# Altium footprint library lib_protel_HC.PCBLIB: 724 footprints (part 19 of 46)
Each footprint in its own frame and in the unit in brackets; x right, y up, seen from the top. Pads: shape width x height; smd on the part's side, far side on the other; paste and mask are expansions set on the pad; w line width, h text height; cw(c..) or ccw(c..) is an arc to the next point about the centre after c.
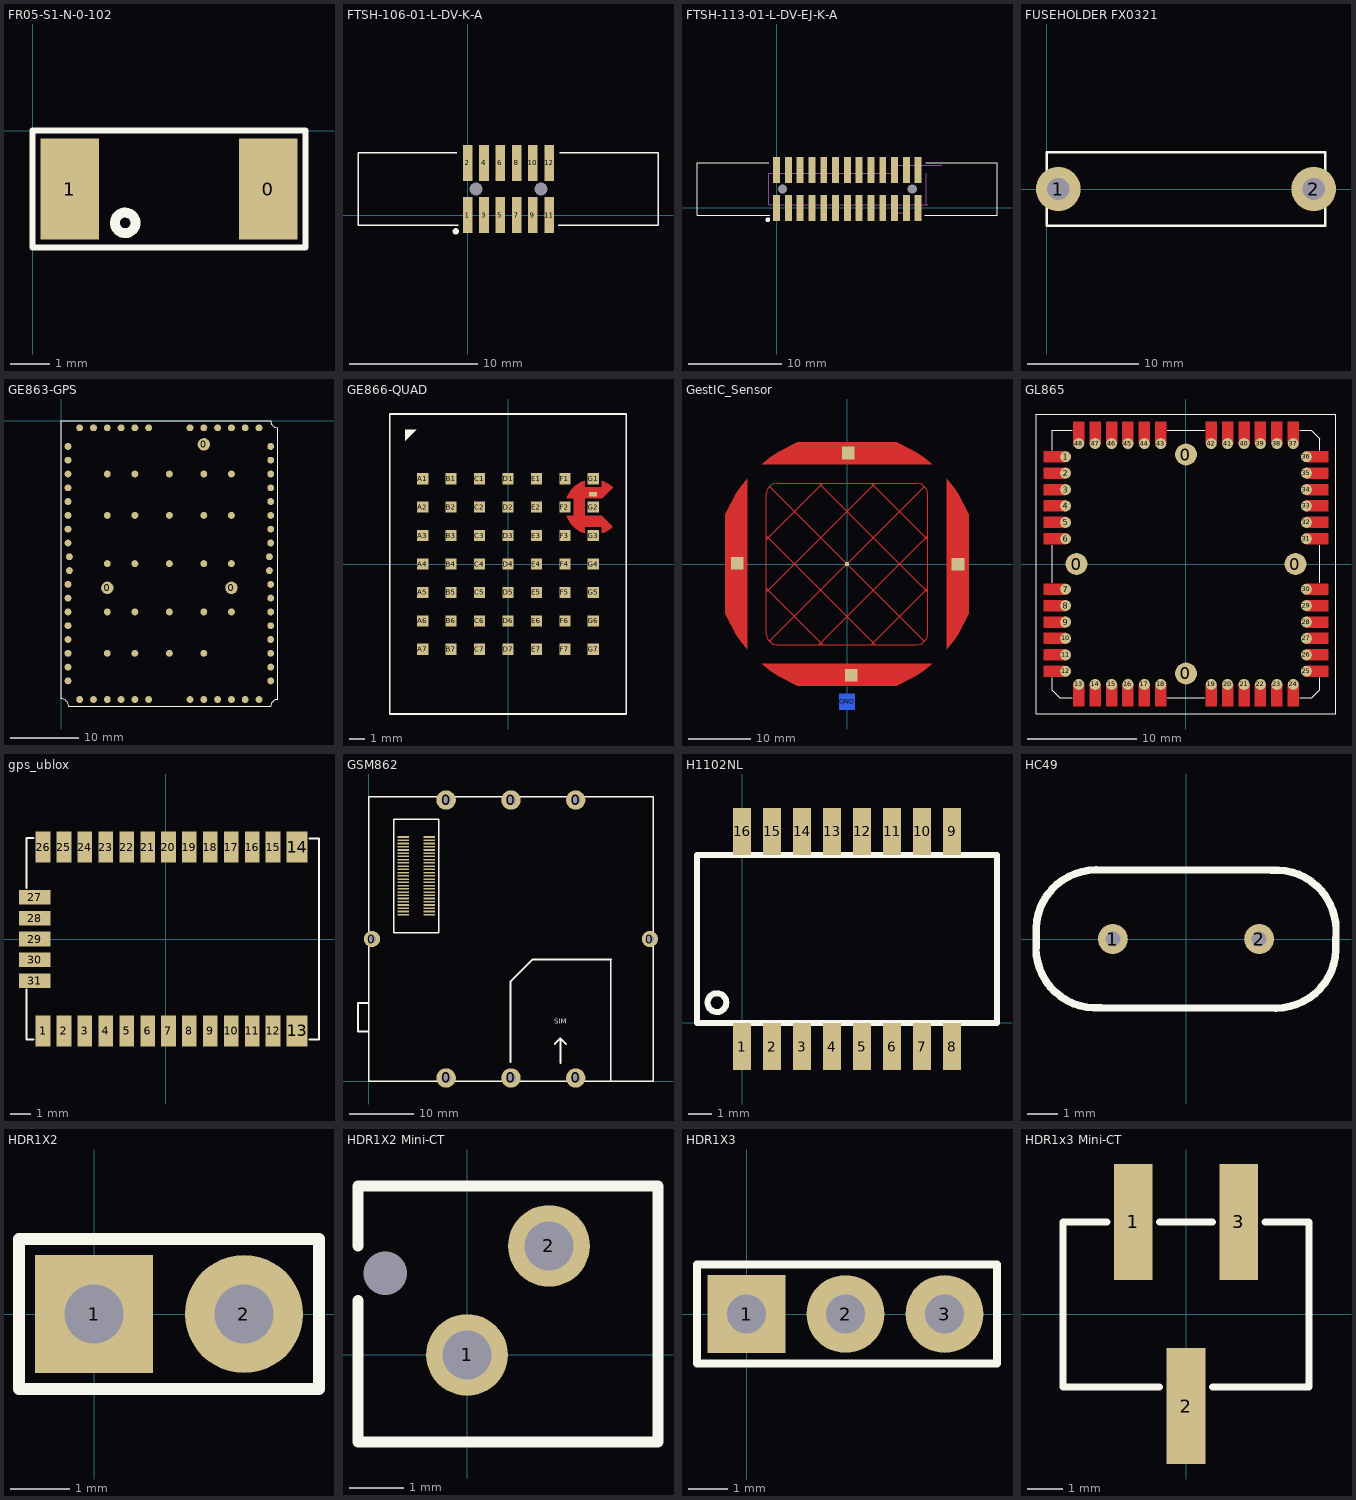
[diagram p18: the footprints below, top view; thin cyan lines are the x and y axes]

## FR05-S1-N-0-102 [mm] "ANTENA ZIGBEE"
height 2
pads (2):
  rect 1.5x2.6 smd: 0(6.05,-1.5) 1(0.95,-1.5)
Top Overlay:
  circle w0.254: c2.376,-2.37 r0.264
  lines w0.15: 0,-3 7,-3 7,0 0,0 0,-3

## FTSH-106-01-L-DV-K-A [mm] "CONNECTOR SAMTEC FTSH-106-01-L-DV-K-A"
height 5.7
pads (14):
  round 0.5 hole 1 unplated mask+0: 0(0.635,2.03) 0(5.715,2.03)
  rect 0.75x2.8 smd mask+0: 1(0,0) 2(0,4.06) 3(1.27,0) 4(1.27,4.06) 5(2.54,0) 6(2.54,4.06) 7(3.81,0) 8(3.81,4.06) 9(5.08,0) 10(5.08,4.06) 11(6.35,0) 12(6.35,4.06)
Top Overlay:
  circle w0.25: c-0.938,-1.27 r0.125
  lines w0.1: -0.864,4.851 -8.56,4.851 -8.56,-0.787 -0.737,-0.787 ; 7.061,-0.787 14.834,-0.787 14.834,4.851 7.163,4.851

## FTSH-113-01-L-DV-EJ-K-A [mm] "CONNECTOR SAMTEC FTSH-113-01-L-DV-EJ-K-A"
height 5.7
pads (28):
  round 0.5 hole 1 unplated mask+0: 0(0.635,2.03) 0(14.605,2.03)
  rect 0.75x2.8 smd mask+0: 1(0,0) 2(0,4.06) 3(1.27,0) 4(1.27,4.06) 5(2.54,0) 6(2.54,4.06) 7(3.81,0) 8(3.81,4.06) 9(5.08,0) 10(5.08,4.06) 11(6.35,0) 12(6.35,4.06) 13(7.62,0) 14(7.62,4.06) 15(8.89,0) 16(8.89,4.06) 17(10.16,0) 18(10.16,4.06) 19(11.43,0) 20(11.43,4.06) 21(12.7,0) 22(12.7,4.06) 23(13.97,0) 24(13.97,4.06) 25(15.24,0) 26(15.24,4.06)
Top Overlay:
  circle w0.25: c-0.938,-1.27 r0.125
  lines w0.1: -0.864,4.851 -8.56,4.851 -8.56,-0.787 -0.737,-0.787 ; 15.951,-0.787 23.724,-0.787 23.724,4.851 16.053,4.851
Mechanical 12:
  lines w0.001: 16.1,0.33 16.1,3.73 ; 16.34,0.33 14.14,0.33 14.14,-0.51 12.69,-0.51 12.69,0.33 -0.86,0.33 -0.86,3.73 12.54,3.73 12.54,4.58 17.79,4.58
Mechanical 13:
  lines w0.1: 12.54,3.73 12.54,4.58 ; 12.69,-0.51 12.69,0.33 14.14,0.33 14.14,-0.51 12.69,-0.51

## FUSEHOLDER FX0321 [mm] "PORTAFUSIBLES HASTA 6.3A"
height 10
pads (2):
  round 4 hole 2 mask+0.1: 1(1.041,0) 2(23.952,0)
Top Overlay:
  lines w0.254: 0,-0.051 0,-3.302 24.994,-3.302 24.994,3.302 0,3.302 0,0

## GE863-GPS [mm]
pads (87):
  round 1.8 smd: 0(6.7,-24.194) 0(20.7,-3.394) 0(24.7,-24.194)
  round 1 smd: 1(1,-3.694) 2(1,-5.694) 3(1,-7.694) 4(1,-9.694) 5(1,-11.694) 6(1,-13.694) 7(1,-15.694) 8(1,-17.694) 9(1,-23.694) 10(1,-25.694) 11(1,-27.694) 12(1,-29.694) 13(1,-31.694) 14(1,-33.694) 15(1,-35.694) 16(1,-37.694) 17(2.7,-40.394) 18(4.7,-40.394) 19(6.7,-40.394) 20(8.7,-40.394) 21(10.7,-40.394) 22(12.7,-40.394) 23(18.7,-40.394) 24(20.7,-40.394) 25(22.7,-40.394) 26(24.7,-40.394) 27(26.7,-40.394) 28(28.7,-40.394) 29(30.4,-37.694) 30(30.4,-35.694) 31(30.4,-33.694) 32(30.4,-31.694) 33(30.4,-29.694) 34(30.4,-27.694) 35(30.4,-25.694) 36(30.4,-23.694) 37(30.4,-17.694) 38(30.4,-15.694) 39(30.4,-13.694) 40(30.4,-11.694) 41(30.4,-9.694) 42(30.4,-7.694) 43(30.4,-5.694) 44(30.4,-3.694) 45(28.7,-0.994) 46(26.7,-0.994) 47(24.7,-0.994) 48(22.7,-0.994) 49(20.7,-0.994) 50(18.7,-0.994) 51(12.7,-0.994) 52(10.7,-0.994) 53(8.7,-0.994) 54(6.7,-0.994) 55(4.7,-0.994) 56(2.7,-0.994) 57(6.7,-7.694) 58(6.7,-13.694) 59(6.7,-20.694) 60(6.7,-27.694) 61(6.7,-33.694) 62(10.7,-7.694) 63(10.7,-13.694) 64(10.7,-20.694) 65(10.7,-27.694) 66(10.7,-33.694) 67(15.7,-7.694) 68(15.7,-13.694) 69(15.7,-20.694) 70(15.7,-27.694) 71(15.7,-33.694) 72(20.7,-7.694) 73(20.7,-13.694) 74(20.7,-20.694) 75(20.7,-27.694) 76(20.7,-33.694) 77(24.7,-7.694) 78(24.7,-13.694) 79(24.7,-20.694) 80(24.7,-27.694) 81(1.2,-19.694) 82(1.2,-21.694) 83(30.2,-21.694) 84(30.2,-19.694)
Top Overlay:
  lines w0.127: 0,-40.294 cw(c0,-41.394) 1.1,-41.394 30.4,-41.394 cw(c31.4,-41.394) 31.4,-40.394 31.4,-0.994 cw(c31.4,0.006) 30.4,0.006 0,0.006 0,-40.294

## GE866-QUAD [mm]
height 2.2
pads (50):
  rect 0.5x0.3 smd paste+0: 0(5.38,4.42)
  rect 0.7x0.7 smd: A1(-5.4,5.4) A2(-5.4,3.6) A3(-5.4,1.8) A4(-5.4,0) A5(-5.4,-1.8) A6(-5.4,-3.6) A7(-5.4,-5.4) B1(-3.6,5.4) B2(-3.6,3.6) B3(-3.6,1.8) B4(-3.6,0) B5(-3.6,-1.8) B6(-3.6,-3.6) B7(-3.6,-5.4) C1(-1.8,5.4) C2(-1.8,3.6) C3(-1.8,1.8) C4(-1.8,0) C5(-1.8,-1.8) C6(-1.8,-3.6) C7(-1.8,-5.4) D1(0,5.4) D2(0,3.6) D3(0,1.8) D4(0,0) D5(0,-1.8) D6(0,-3.6) D7(0,-5.4) E1(1.8,5.4) E2(1.8,3.6) E3(1.8,1.8) E4(1.8,0) E5(1.8,-1.8) E6(1.8,-3.6) E7(1.8,-5.4) F1(3.6,5.4) F2(3.6,3.6) F3(3.6,1.8) F4(3.6,0) F5(3.6,-1.8) F6(3.6,-3.6) F7(3.6,-5.4) G1(5.4,5.4) G2(5.4,3.6) G3(5.4,1.8) G4(5.4,0) G5(5.4,-1.8) G6(5.4,-3.6) G7(5.4,-5.4)
Top Layer:
  region: 4.848,1.939 4.85,1.939 4.852,1.939 4.854,1.941 4.855,1.943 4.855,1.944 4.855,2.363 5.945,2.363 5.945,1.945 5.945,1.944 5.945,1.943 5.945,1.942 5.946,1.941 5.947,1.94 5.949,1.939 5.951,1.939 5.952,1.939 5.95,1.939 5.952,1.939 6.049,1.972 6.234,2.058 6.408,2.165 6.569,2.292 6.641,2.365 6.642,2.365 6.642,2.366 6.643,2.367 6.643,2.368 6.643,2.369 6.643,2.37 6.642,2.371 6.642,2.372 6.641,2.372 5.952,3.049 5.951,3.049 5.95,3.05 5.948,3.05 4.85,3.05 4.85,3.6 4.85,4.15 5.95,4.15 5.951,4.15 5.952,4.151 5.953,4.151 5.953,4.152 5.954,4.152 6.641,4.839 6.642,4.84 6.642,4.841 6.643,4.842 6.643,4.843 6.643,4.844 6.643,4.845 6.642,4.846 6.642,4.847 6.641,4.847 6.569,4.919 6.408,5.046 6.234,5.154 6.049,5.24 5.952,5.272 5.95,5.273 5.948,5.272 5.946,5.271 5.945,5.268 5.945,5.267 5.945,4.849 4.855,4.849 4.855,5.267 4.855,5.268 4.854,5.271 4.852,5.272 4.85,5.273 4.848,5.272 4.653,5.208 4.304,4.992 4.014,4.702 3.798,4.352 3.734,4.158 3.733,4.156 3.734,4.154 3.735,4.152 3.737,4.15 3.739,4.15 4.157,4.15 4.157,3.061 3.739,3.061 3.737,3.061 3.735,3.06 3.734,3.058 3.733,3.055 3.734,3.054 3.798,2.859 4.014,2.51 4.304,2.219 4.653,2.004
Top Overlay:
  region: -6.5,7.8 -6.5,8.5 -5.8,8.5
  lines w0.1: -7.5,-9.5 -7.5,9.5 7.5,9.5 7.5,-9.5 -7.5,-9.5
3D body: height 2.2, standoff 0, extent -7.45,-9.5 7.45,9.5

## GestIC_Sensor [mm]
height 1.546
pads (7):
  round 0.7 smd: Centro(-0.003,0.003)
  rect 2x2 smd mask+0.102: Este(17.725,-0.05) Norte(0.175,17.725) Oeste(-17.5,0.125)
  rect 2.54x2.54 smd far side: GND(0,-22)
  rect 2x2 smd: Sur(0.675,-17.8)
  round 0.75 on Mid2: Tx(10.022,4.775)
Top Layer:
  region: 15.9,13.641 15.9,-13.641 16.175,-13.321 16.698,-12.66 17.194,-11.978 17.662,-11.276 18.101,-10.556 18.511,-9.819 18.891,-9.066 19.241,-8.299 19.4,-7.908 19.4,7.908 19.241,8.299 18.891,9.066 18.511,9.819 18.101,10.556 17.662,11.276 17.194,11.978 16.698,12.66 16.175,13.321
  region: 13.641,-15.9 -13.641,-15.9 -13.321,-16.175 -12.66,-16.698 -11.978,-17.194 -11.276,-17.662 -10.556,-18.101 -9.819,-18.511 -9.066,-18.891 -8.299,-19.241 -7.908,-19.4 7.908,-19.4 8.299,-19.241 9.066,-18.891 9.819,-18.511 10.556,-18.101 11.276,-17.662 11.978,-17.194 12.66,-16.698 13.321,-16.175
  region: -15.9,-13.641 -15.9,13.641 -16.175,13.321 -16.698,12.66 -17.194,11.978 -17.662,11.276 -18.101,10.556 -18.511,9.819 -18.891,9.066 -19.241,8.299 -19.4,7.908 -19.4,-7.908 -19.241,-8.299 -18.891,-9.066 -18.511,-9.819 -18.101,-10.556 -17.662,-11.276 -17.194,-11.978 -16.698,-12.66 -16.175,-13.321
  region: -13.641,15.9 13.641,15.9 13.321,16.175 12.66,16.698 11.978,17.194 11.276,17.662 10.556,18.101 9.819,18.511 9.066,18.891 8.299,19.241 7.908,19.4 -7.908,19.4 -8.299,19.241 -9.066,18.891 -9.819,18.511 -10.556,18.101 -11.276,17.662 -11.978,17.194 -12.66,16.698 -13.321,16.175
  lines w0.125: -12.9,-11.1 ccw(c-11.1,-11.1) -11.1,-12.901 ; -12.9,-11.075 -12.9,11.108 ; -12.901,-4.524 4.5,12.877 ; -12.9,-3.855 -3.865,-12.89 ; -12.9,11.107 cw(c-11.108,11.108) -11.107,12.9 11.1,12.9 ; -12.892,3.858 -3.858,12.892 ; -12.873,4.5 4.526,-12.899 ; -12.378,-12.372 12.367,12.372 ; -12.375,12.375 12.37,-12.37 ; -11.125,-12.9 11.1,-12.9 ccw(c11.1,-11.1) 12.9,-11.1 ; -4.526,12.899 12.873,-4.5 ; -4.5,-12.877 12.901,4.524 ; 3.858,-12.892 12.892,-3.858 ; 3.865,12.89 12.9,3.855 ; 11.1,12.9 cw(c11.1,11.1) 12.9,11.1 ; 12.9,-11.15 12.9,11.074
Mid-Layer 2:
  circle w0.25: c10.022,4.775 r0.75
  circle w0.225: c0,0 r23.95
  circle w0.25: c0,0 r0.75
  lines w0.225: -23.95,0 -17.125,-0.001 ; -23.832,-2.379 -12.907,-2.379 ; -23.832,2.379 -12.907,2.379 ; -23.639,-3.839 -23.639,3.834 ; -23.473,-4.748 -12.907,-4.748 ; -23.473,4.748 -12.907,4.748 ; -22.867,7.117 -12.907,7.117 ; -22.863,-7.117 -12.907,-7.117 ; -21.996,-9.486 -12.907,-9.486 ; -21.989,9.486 -12.907,9.486 ; -21.27,-11 -21.27,11 ; -20.816,-11.855 -12.741,-11.855 ; -20.811,11.855 -12.741,11.855 ; -19.266,-14.224 1.05,-14.224 ; -19.224,14.224 -4.85,14.224 ; -18.901,-14.701 -18.901,14.7 ; -17.268,-16.593 0.775,-16.593 ; -17.268,16.593 -4.45,16.593 ; -16.532,-17.325 -16.532,-0.75 ; -16.532,0.732 -16.532,17.325 ; -14.625,-18.962 14.625,-18.962 ; -14.625,18.962 14.625,18.962 ; -14.163,-19.312 -14.163,-0.448 ; -14.163,0.466 -14.163,19.312 ; -12.907,0.45 -12.907,11.075 -4.85,11.075 ; -12.907,0.827 -4.6,0.827 ; -12.907,5.089 -4.425,5.089 ; -12.906,4.25 -4.425,4.25 ; -12.9,-10.275 1.05,-10.275 ; -12.9,-9.421 1.05,-9.421 ; -12.9,-8.567 1.05,-8.567 ; -12.9,-7.713 1.05,-7.713 ; -12.9,-6.859 1.05,-6.859 ; -12.9,-6.005 1.05,-6.005 ; -12.9,-5.151 1.05,-5.151 ; -12.9,-4.297 1.05,-4.297 ; -12.9,-3.443 1.05,-3.443 ; -12.9,-2.589 1.05,-2.589 ; -12.9,-1.735 1.05,-1.735 ; -12.9,-0.881 1.05,-0.881 ; -12.9,-0.45 -12.9,-11.1 ccw(c-11.1,-11.1) -11.1,-12.9 ; -12.9,7.659 -4.4,7.659 ; -12.9,11.1 cw(c-11.1,11.1) -11.1,12.9 ; -12.897,2.535 -4.425,2.535 ; -12.897,6.805 -4.425,6.805 ; -12.897,10.221 -4.85,10.221 ; -12.894,-11.129 1.05,-11.129 ; -12.894,1.681 -4.575,1.681 ; -12.892,9.367 -4.85,9.367 ; -12.889,3.389 -4.425,3.389 ; -12.884,8.513 -4.85,8.513 ; -12.876,5.951 -4.425,5.951 ; -12.791,-11.71 -12.791,-0.448 ; -12.791,0.441 -12.791,11.719 ; -12.675,-11.983 1.05,-11.983 ; -12.654,11.929 -4.85,11.929 ; -11.937,-12.688 -11.937,-0.448 ; -11.937,0.45 -11.937,12.688 ; -11.794,-20.844 -11.794,-12.769 ; -11.794,12.766 -11.794,20.843 ; -11.562,-12.837 1.049,-12.837 ; -11.1,0.45 -11.1,12.899 ; -11.083,-0.448 -11.083,-12.9 1.05,-12.9 ; -10.887,-21.331 10.875,-21.331 ; -10.887,21.331 10.875,21.331 ; -10.229,-12.9 -10.229,-0.448 ; -10.229,0.45 -10.229,12.9 ; -9.425,-22.025 -9.425,-12.9 ; -9.425,12.9 -9.425,22.024 ; -9.375,-12.9 -9.375,-0.448 ; -9.375,0.45 -9.375,12.9 ; -8.521,-12.9 -8.521,-0.448 ; -8.521,0.451 -8.521,12.9 ; -7.667,-12.9 -7.667,-0.448 ; -7.667,0.451 -7.667,12.9 ; -7.056,-22.881 -7.056,-12.9 ; -7.056,12.9 -7.056,22.88 ; -6.813,-12.9 -6.813,-0.448 ; -6.813,0.451 -6.813,12.9 ; -5.959,-12.9 -5.959,-0.448 ; -5.959,0.451 -5.959,12.9 ; -5.105,-12.9 -5.105,-0.448 ; -5.105,0.45 -5.105,12.9 ; -4.85,12.899 -11.1,12.899 ; -4.687,-23.487 -4.687,-12.9 ; -4.687,15.4 -4.687,17.25 ; -4.687,17.737 -4.687,23.486 ; -4.251,-12.9 -4.251,-0.448 ; -3.9,8.513 12.9,8.513 ; -3.9,9.367 12.9,9.367 ; -3.9,10.224 12.9,10.221 ; -3.9,11.075 12.9,11.075 12.9,0.45 ; -3.9,11.929 12.7,11.929 ; -3.9,12.9 11.1,12.9 cw(c11.1,11.1) 12.9,11.1 ; -3.9,14.224 19.259,14.224 ; -3.525,3.389 12.9,3.389 ; -3.525,5.097 9.347,5.097 ; -3.525,5.951 12.9,5.951 ; -3.525,6.805 12.9,6.805 ; -3.525,7.659 12.9,7.659 ; -3.523,2.535 12.9,2.535 ; -3.523,4.25 9.494,4.244 ; -3.504,16.593 17.25,16.593 ; -3.428,23.7 3.45,23.7 ; -3.425,-23.7 3.43,-23.7 ; -3.397,-12.9 -3.397,-0.448 ; -3.397,1.703 -3.397,12.9 ; -3.375,1.681 12.9,1.681 ; -3.345,0.827 12.9,0.827 ; -2.543,-12.9 -2.543,-0.448 ; -2.543,0.917 -2.543,12.9 ; -2.318,-23.832 -2.318,-12.9 ; -2.318,12.905 -2.318,23.831 ; -1.689,-12.9 -1.689,-0.727 ; -1.689,0.72 -1.689,12.9 ; -0.85,-12.9 -0.85,-0.375 ; -0.835,0.35 -0.835,12.9 ; 0.019,-12.9 0.019,-0.75 ; 0.019,0.75 0.019,12.887 ; 0.051,-23.95 0.052,-12.9 ; 0.051,23.949 0.052,12.902 ; 0.873,0.425 0.873,12.9 ; 1.727,0.72 1.727,12.9 ; 1.948,-10.275 12.898,-10.275 ; 1.948,-9.421 12.898,-9.421 ; 1.948,-8.567 12.898,-8.567 ; 1.948,-7.713 12.898,-7.713 ; 1.948,-6.859 12.898,-6.859 ; 1.948,-6.005 12.898,-6.005 ; 1.948,-5.151 12.898,-5.151 ; 1.948,-4.297 12.898,-4.297 ; 1.948,-3.443 12.898,-3.443 ; 1.948,-2.589 12.898,-2.589 ; 1.948,-1.735 12.898,-1.735 ; 1.948,-0.881 12.898,-0.881 ; 1.95,-12.9 11.1,-12.9 ccw(c11.1,-11.1) 12.9,-11.1 12.9,-0.451 ; 1.95,-11.983 12.608,-11.983 ; 1.95,-11.129 12.875,-11.129 ; 1.951,-14.224 19.249,-14.224 ; 1.952,-12.837 11.55,-12.837 ; 2.225,-16.593 17.275,-16.593 ; 2.42,-23.825 2.42,-12.9 ; 2.42,12.905 2.42,23.824 ; 2.581,-12.895 2.581,-0.6 ; 2.581,0.606 2.581,12.9 ; 3.435,-12.895 3.435,-0.626 ; 3.435,0.631 3.435,12.9 ; 4.289,-12.879 4.289,-0.45 ; 4.289,0.45 4.289,12.9 ; 4.789,-23.464 4.789,-12.9 ; 4.789,12.901 4.789,23.463 ; 5.143,-12.879 5.143,-0.45 ; 5.143,0.45 5.143,12.9 ; 5.997,-12.879 5.997,-0.45 ; 5.997,0.45 5.997,12.9 ; 6.851,-12.879 6.851,-0.45 ; 6.851,0.45 6.851,12.9 ; 7.158,-22.858 7.158,-12.9 ; 7.158,12.899 7.158,22.857 ; 7.705,-12.879 7.705,-0.45 ; 7.705,0.45 7.705,12.9 ; 8.559,-12.879 8.559,-0.45 ; 8.568,0.45 8.575,12.9 ; 9.413,-12.879 9.413,-0.45 ; 9.413,0.45 9.413,4.337 ; 9.413,5.225 9.413,12.887 ; 9.527,-21.973 9.527,-12.9 ; 9.527,12.899 9.527,21.972 ; 10.267,-12.879 10.267,-0.45 ; 10.267,0.45 10.267,4.067 ; 10.267,5.483 10.267,12.883 ; 10.55,4.25 12.9,4.25 ; 10.7,5.097 12.9,5.097 ; 11.121,-12.879 11.121,-0.45 11.121,-12.204 ; 11.121,0.45 11.121,12.9 ; 11.896,-20.779 11.896,-12.716 ; 11.896,12.715 11.896,20.778 ; 11.975,-12.65 11.975,-0.451 ; 11.975,0.45 11.975,12.675 ; 12.734,-11.855 20.809,-11.855 ; 12.734,11.855 20.809,11.855 ; 12.9,-9.486 21.989,-9.486 ; 12.9,-7.117 22.867,-7.117 ; 12.9,-4.748 23.473,-4.748 ; 12.9,-2.379 23.825,-2.379 ; 12.9,2.379 23.825,2.379 ; 12.9,4.748 23.473,4.748 ; 12.9,7.117 22.867,7.117 ; 12.9,9.486 21.989,9.486 ; 14.265,-19.235 14.265,-0.451 ; 14.265,0.459 14.265,19.235 ; 16.634,-17.225 16.634,-0.725 ; 16.634,0.725 16.634,17.23 ; 17.175,0 23.95,0 ; 19.003,-14.575 19.003,14.575 ; 21.372,-10.8 21.372,10.804 ; 23.741,-3.141 23.741,3.15
  lines w0.25: -15.774,0.448 ccw(c-16.375,-0.001) -15.773,-0.449 -2.105,-0.448 ; -15.775,0.45 -2.103,0.45 ; -4.428,1.829 ccw(c-3.979,1.228) -3.523,1.824 ; -4.425,1.829 -4.425,7.725 -4.85,8.15 -4.85,15.225 -4.45,15.625 -4.45,16.92 cw(c-3.975,17.5) -3.5,16.919 -3.5,15.35 -3.9,14.95 -3.9,8.4 -3.525,8.025 -3.525,1.824 ; -2.105,-0.448 ccw(c-1.502,-0.001) -2.101,0.451 ; 1.049,-15.774 ccw(c1.5,-16.374) 1.951,-15.774 ; 1.05,-15.774 1.05,-0.6 cw(c1.5,0) 1.952,-0.599 ; 1.95,-15.774 1.95,-0.6 ; 3.625,-0.45 cw(c3.025,0) 3.625,0.45 ; 3.625,-0.45 15.825,-0.45 ; 3.625,0.45 15.824,0.45 ; 9.275,4.775 10.772,4.775 ; 10.022,4.025 10.022,5.525 ; 15.824,-0.451 ccw(c16.423,0) 15.824,0.451

## GL865 [mm]
pads (52):
  round 2 smd: 0(-10,0) 0(0,-10) 0(0,10) 0(10,0)
  round 1 smd: 1(-11,9.8) 2(-11,8.3) 3(-11,6.8) 4(-11,5.3) 5(-11,3.8) 6(-11,2.3) 7(-11,-2.3) 8(-11,-3.8) 9(-11,-5.3) 10(-11,-6.8) 11(-11,-8.3) 12(-11,-9.8) 13(-9.8,-11) 14(-8.3,-11) 15(-6.8,-11) 16(-5.3,-11) 17(-3.8,-11) 18(-2.3,-11) 19(2.3,-11) 20(3.8,-11) 21(5.3,-11) 22(6.8,-11) 23(8.3,-11) 24(9.8,-11) 25(11,-9.8) 26(11,-8.3) 27(11,-6.8) 28(11,-5.3) 29(11,-3.8) 30(11,-2.3) 31(11,2.3) 32(11,3.8) 33(11,5.3) 34(11,6.8) 35(11,8.3) 36(11,9.8) 37(9.8,11) 38(8.3,11) 39(6.8,11) 40(5.3,11) 41(3.8,11) 42(2.3,11) 43(-2.3,11) 44(-3.8,11) 45(-5.3,11) 46(-6.8,11) 47(-8.3,11) 48(-9.8,11)
Top Layer:
  region: 11,9.3 13,9.3 13,10.3 11,10.3
  region: 2.8,11 2.8,13 1.8,13 1.8,11
  region: 4.3,11 4.3,13 3.3,13 3.3,11
  region: 5.8,11 5.8,13 4.8,13 4.8,11
  region: 7.3,11 7.3,13 6.3,13 6.3,11
  region: 8.8,11 8.8,13 7.8,13 7.8,11
  region: 10.3,11 10.3,13 9.3,13 9.3,11
  region: -1.8,11 -1.8,13 -2.8,13 -2.8,11
  region: -3.3,11 -3.3,13 -4.3,13 -4.3,11
  region: -4.8,11 -4.8,13 -5.8,13 -5.8,11
  region: -6.3,11 -6.3,13 -7.3,13 -7.3,11
  region: -7.8,11 -7.8,13 -8.8,13 -8.8,11
  region: -9.3,11 -9.3,13 -10.3,13 -10.3,11
  region: 9.3,-11 9.3,-13 10.3,-13 10.3,-11
  region: 7.8,-11 7.8,-13 8.8,-13 8.8,-11
  region: 6.3,-11 6.3,-13 7.3,-13 7.3,-11
  region: 4.8,-11 4.8,-13 5.8,-13 5.8,-11
  region: 3.3,-11 3.3,-13 4.3,-13 4.3,-11
  region: 1.8,-11 1.8,-13 2.8,-13 2.8,-11
  region: -11,2.8 -13,2.8 -13,1.8 -11,1.8
  region: -11,4.3 -13,4.3 -13,3.3 -11,3.3
  region: -11,5.8 -13,5.8 -13,4.8 -11,4.8
  region: -11,7.3 -13,7.3 -13,6.3 -11,6.3
  region: -11,8.8 -13,8.8 -13,7.8 -11,7.8
  region: -11,10.3 -13,10.3 -13,9.3 -11,9.3
  region: -11,-1.8 -13,-1.8 -13,-2.8 -11,-2.8
  region: -11,-3.3 -13,-3.3 -13,-4.3 -11,-4.3
  region: -11,-4.8 -13,-4.8 -13,-5.8 -11,-5.8
  region: -11,-6.3 -13,-6.3 -13,-7.3 -11,-7.3
  region: -11,-7.8 -13,-7.8 -13,-8.8 -11,-8.8
  region: -11,-9.3 -13,-9.3 -13,-10.3 -11,-10.3
  region: -10.3,-11 -10.3,-13 -9.3,-13 -9.3,-11
  region: -8.8,-11 -8.8,-13 -7.8,-13 -7.8,-11
  region: -7.3,-11 -7.3,-13 -6.3,-13 -6.3,-11
  region: -5.8,-11 -5.8,-13 -4.8,-13 -4.8,-11
  region: -4.3,-11 -4.3,-13 -3.3,-13 -3.3,-11
  region: -2.8,-11 -2.8,-13 -1.8,-13 -1.8,-11
  region: 11,7.8 13,7.8 13,8.8 11,8.8
  region: 11,6.3 13,6.3 13,7.3 11,7.3
  region: 11,4.8 13,4.8 13,5.8 11,5.8
  region: 11,3.3 13,3.3 13,4.3 11,4.3
  region: 11,-2.8 13,-2.8 13,-1.8 11,-1.8
  region: 11,-4.3 13,-4.3 13,-3.3 11,-3.3
  region: 11,-5.8 13,-5.8 13,-4.8 11,-4.8
  region: 11,-7.3 13,-7.3 13,-6.3 11,-6.3
  region: 11,-8.8 13,-8.8 13,-7.8 11,-7.8
  region: 11,-10.3 13,-10.3 13,-9.3 11,-9.3
  region: 11,1.8 13,1.8 13,2.8 11,2.8
Top Overlay:
  lines w0.1: -12.2,-10.4 -12.2,-11.55 -11.55,-12.2 -10.4,-12.2 ; -12.2,-1.7 -12.2,1.7 ; -12.2,10.4 -12.2,12.2 -10.4,12.2 ; -1.7,-12.2 1.7,-12.2 ; -1.7,12.2 1.7,12.2 ; 10.4,-12.2 11.5,-12.2 12.2,-11.5 12.2,-10.4 ; 10.4,12.2 11.45,12.2 12.2,11.45 12.2,10.4 ; 12.2,-1.7 12.2,1.7 ; -13.7,-13.7 -13.7,13.7 13.7,13.7 13.7,-13.7 -13.7,-13.7

## gps_ublox [mm] "Modulo TinyMesh de Radiocraft"
height 3.3
pads (31):
  rect 0.7x1.5 smd: 1(-5.875,-4.4) 2(-4.875,-4.4) 3(-3.875,-4.4) 4(-2.875,-4.4) 5(-1.875,-4.4) 6(-0.875,-4.4) 7(0.125,-4.4) 8(1.125,-4.4) 9(2.125,-4.4) 10(3.125,-4.4) 11(4.125,-4.4) 12(5.125,-4.4) 15(5.125,4.4) 16(4.125,4.4) 17(3.125,4.4) 18(2.125,4.4) 19(1.125,4.4) 20(0.125,4.4) 21(-0.875,4.4) 22(-1.875,4.4) 23(-2.875,4.4) 24(-3.875,4.4) 25(-4.875,4.4) 26(-5.875,4.4)
  rect 1x1.5 smd: 13(6.275,-4.4) 14(6.275,4.4)
  rect 1.5x0.7 smd: 27(-6.275,2) 28(-6.275,1) 29(-6.275,0) 30(-6.275,-1) 31(-6.275,-2)
Top Overlay:
  lines w0.1: -6.675,-2.425 -6.675,-4.5 -6.675,-4.8 ; -6.675,2.45 -6.675,3.9 -6.675,4.825 ; -6.325,-4.8 -6.675,-4.8 ; -6.325,4.825 -6.675,4.825 ; 6.875,-4.8 7.325,-4.8 ; 6.875,4.8 7.325,4.8 ; -6.675,-4.8 -6.675,-4.8 ; -6.675,4.825 -6.675,4.825 ; 7.325,-4.8 7.325,-4.8 ; 7.325,-4.8 7.325,-2 7.325,2.975 7.325,4.8 ; 7.325,4.8 7.325,4.8

## GSM862 [mm]
height 6.9
pads (58):
  round 2.5 hole 1.2: 0(0.5,21.95) 0(43.4,21.95)
  round 3 hole 1.5: 0(11.95,0.5) 0(11.95,43.4) 0(21.95,0.5) 0(21.95,43.4) 0(31.95,0.5) 0(31.95,43.4)
  rect 1.8x0.25 smd: 1(9.346,25.693) 2(5.346,25.693) 3(9.346,26.193) 4(5.346,26.193) 5(9.346,26.693) 6(5.346,26.693) 7(9.346,27.193) 8(5.346,27.193) 9(9.346,27.693) 10(5.346,27.693) 11(9.346,28.193) 12(5.346,28.193) 13(9.346,28.693) 14(5.346,28.693) 15(9.346,29.193) 16(5.346,29.193) 17(9.346,29.693) 18(5.346,29.693) 19(9.346,30.193) 20(5.346,30.193) 21(9.346,30.693) 22(5.346,30.693) 23(9.346,31.193) 24(5.346,31.193) 25(9.346,31.693) 26(5.346,31.693) 27(9.346,32.193) 28(5.346,32.193) 29(9.346,32.693) 30(5.346,32.693) 31(9.346,33.193) 32(5.346,33.193) 33(9.346,33.693) 34(5.346,33.693) 35(9.346,34.193) 36(5.346,34.193) 37(9.346,34.693) 38(5.346,34.693) 39(9.346,35.193) 40(5.346,35.193) 41(9.346,35.693) 42(5.346,35.693) 43(9.346,36.193) 44(5.346,36.193) 45(9.346,36.693) 46(5.346,36.693) 47(9.346,37.193) 48(5.346,37.193) 49(9.346,37.693) 50(5.346,37.693)
Top Overlay:
  lines w0.203: 0,0 43.9,0 43.9,43.9 0,43.9 0,0 ; 3.85,22.95 10.85,22.95 10.85,40.45 3.85,40.45 3.85,22.95
  lines w0.3: -0.04,12.09 -1.64,12.09 -1.64,7.7 -1.65,7.69 -0.02,7.69 ; 21.87,2.96 21.87,15.38 25.25,18.76 37.37,18.76 37.36,18.75 37.36,0.05 ; 28.73,5.77 29.58,6.62 ; 29.58,2.84 29.58,6.62 ; 30.43,5.77 29.58,6.62 ; 29.58,6.62 29.58,6.62
  text "SIM" at 28.6,8.86 h0.76

## H1102NL [mm]
height 5.97
pads (16):
  rect 0.76x2 smd: 1(0,-1) 2(1.27,-1) 3(2.54,-1) 4(3.81,-1) 5(5.08,-1) 6(6.35,-1) 7(7.62,-1) 8(8.89,-1) 9(8.89,8.11) 10(7.62,8.11) 11(6.35,8.11) 12(5.08,8.11) 13(3.81,8.11) 14(2.54,8.11) 15(1.27,8.11) 16(0,8.11)
Top Overlay:
  circle w0.254: c-1.06,0.86 r0.396
  lines w0.254: -1.905,0 -1.905,7.11 10.795,7.11 10.795,0 -1.905,0

## HC49 [mm]
pads (2):
  round 1 hole 0.5: 1(-2.44,0) 2(2.44,0)
Top Overlay:
  lines w0.25: -5,-0.3 ccw(c-3,-0.3) -2.834,-2.293 3,-2.3 ccw(c3,-0.3) 4.993,-0.134 5,0.3 ccw(c3,0.3) 2.834,2.293 -3,2.3 ccw(c-3,0.3) -4.993,0.134 -4.993,-0.293

## HDR1X2 [mm]
pads (2):
  rect 2x2 hole 1: 1(0,0)
  round 2 hole 1: 2(2.54,0)
Top Overlay:
  lines w0.2: -1.27,-1.27 -1.27,1.27 3.81,1.27 3.81,-1.27 -1.27,-1.27
3D body "User Library-2PIN.step": height 8, standoff -3, extent -1.27,-1.27 3.81,1.27

## HDR1X2 Mini-CT [mm] "Header 1x2, Pitch = 1.5 mm + tetón"
height 6.9
pads (3):
  round 1.5 hole 0.9: 1(0,0) 2(1.5,2)
  round 0 hole 0.8: ""(-1.5,1.5)
Top Overlay:
  lines w0.2: -2,1 -2,-1.6 3.5,-1.6 3.5,3.1 -2,3.1 -2,2
3D body "c-292207-2-g-3d.stp": height 6.9, standoff -3, extent -2,-1.6 3.5,3.1

## HDR1X3 [mm]
pads (3):
  rect 2x2 hole 1: 1(0,0)
  round 2 hole 1: 2(2.54,0) 3(5.08,0)
Top Overlay:
  lines w0.2: -1.27,-1.27 6.425,-1.27 6.425,1.27 -1.27,1.27 -1.27,-1.27
3D body "4186.stp": height 10.79, standoff -3.43, extent -1.083,-1.2 6.283,1.137

## HDR1x3 Mini-CT [mm] "Header 3Pin, Pitch = 1.5mm Mini-CT"
height 6.9
pads (3):
  rect 1.1x3.3 smd: 1(-1.5,2.625) 2(0,-2.625) 3(1.5,2.625)
Top Overlay:
  lines w0.2: -2.25,2.625 -3.5,2.625 -3.5,-2.075 -0.75,-2.075 ; -0.75,2.625 0.75,2.625 ; 0.75,-2.075 3.5,-2.075 3.5,2.625 2.25,2.625
3D body "c-0292231-03-b1-3d.stp": height 6.9, standoff -0.05, extent -3.5,-3.6 3.5,3.6